# Altium footprint library CONN_B2B.PcbLib: 23 footprints (part 1 of 2)
Each footprint in its own frame and in the unit in brackets; x right, y up, seen from the top. Pads: shape width x height; smd on the part's side, far side on the other; paste and mask are expansions set on the pad; w line width, h text height; cw(c..) or ccw(c..) is an arc to the next point about the centre after c.
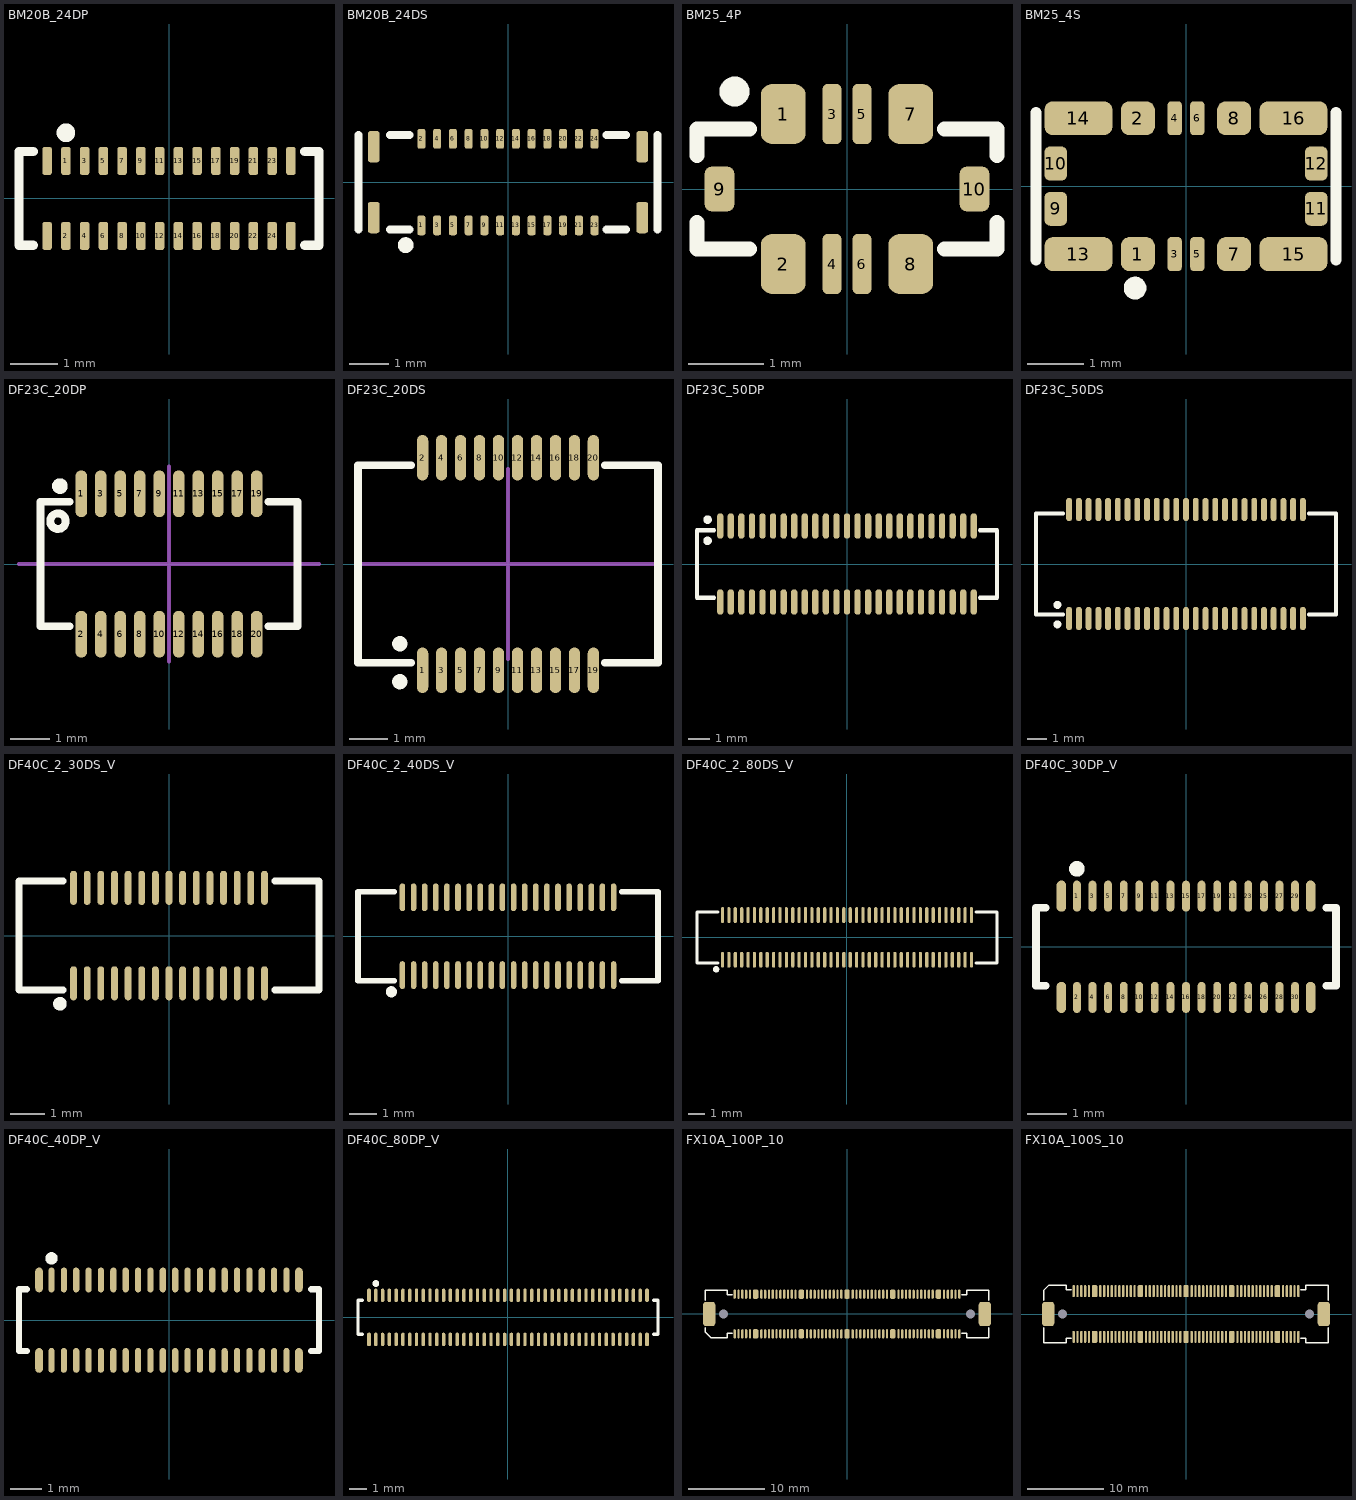
[diagram p0: the footprints below, top view; thin cyan lines are the x and y axes]

## BM20B_24DP [mm] "Hirose Connector BM20B(0.8)-24DP-0.4V(51) 24WAY pitch:0.4mm"
height 0.8
pads (28):
  rrect50% 0.2x0.6 smd mask+0.05: 1(-2.2,0.8) 2(-2.2,-0.8) 3(-1.8,0.8) 4(-1.8,-0.8) 5(-1.4,0.8) 6(-1.4,-0.8) 7(-1,0.8) 8(-1,-0.8) 9(-0.6,0.8) 10(-0.6,-0.8) 11(-0.2,0.8) 12(-0.2,-0.8) 13(0.2,0.8) 14(0.2,-0.8) 15(0.6,0.8) 16(0.6,-0.8) 17(1,0.8) 18(1,-0.8) 19(1.4,0.8) 20(1.4,-0.8) 21(1.8,0.8) 22(1.8,-0.8) 23(2.2,0.8) 24(2.2,-0.8) ""(-2.6,-0.8) ""(-2.6,0.8) ""(2.6,-0.8) ""(2.6,0.8)
Top Overlay:
  circle w0.2: c-2.2,1.4 r0.1
  lines w0.2: -2.9,-1 -3.2,-1 -3.2,1 -2.9,1 ; 2.9,-1 3.2,-1 3.2,1 2.9,1
3D body "BM20B(0.8)-24DP-0.4V.stp": height 0.67, standoff 0.01, extent -3.1,-0.88 3.1,0.9

## BM20B_24DS [mm] "Hirose Connector BM20B(0.8)-24DS-0.4V(51) 24WAY pitch:0.4mm"
height 0.8
pads (28):
  rrect50% 0.2x0.5 smd mask+0.05: 1(-2.2,-1.1) 2(-2.2,1.1) 3(-1.8,-1.1) 4(-1.8,1.1) 5(-1.4,-1.1) 6(-1.4,1.1) 7(-1,-1.1) 8(-1,1.1) 9(-0.6,-1.1) 10(-0.6,1.1) 11(-0.2,-1.1) 12(-0.2,1.1) 13(0.2,-1.1) 14(0.2,1.1) 15(0.6,-1.1) 16(0.6,1.1) 17(1,-1.1) 18(1,1.1) 19(1.4,-1.1) 20(1.4,1.1) 21(1.8,-1.1) 22(1.8,1.1) 23(2.2,-1.1) 24(2.2,1.1)
  rrect50% 0.3x0.8 smd mask+0.05: ""(-3.41,-0.9) ""(-3.41,0.9) ""(3.41,-0.9) ""(3.41,0.9)
Top Overlay:
  circle w0.2: c-2.6,-1.6 r0.1
  lines w0.2: -3.8,-1.2 -3.8,1.2 ; -3,-1.2 -2.5,-1.2 ; -3,1.2 -2.5,1.2 ; 2.5,-1.2 3,-1.2 ; 2.5,1.2 3,1.2 ; 3.8,-1.2 3.8,1.2
3D body "BM20B(0.8)-24DS-0.4V.stp": height 0.79, standoff -0.01, extent -3.645,-1.15 3.635,1.15

## BM25_4P [mm] "Conn B2B, for battery, Hirose BM25-4P-2-V(51)"
pads (10):
  rrect50% 0.6x0.8 smd paste-0.1 mask+0.05: 1(-0.85,1) 2(-0.85,-1) 7(0.85,1) 8(0.85,-1)
  rrect50% 0.25x0.8 smd mask+0.05: 3(-0.2,1) 4(-0.2,-1) 5(0.2,1) 6(0.2,-1)
  rrect50% 0.4x0.6 smd: 9(-1.7,0) 10(1.7,0)
Top Overlay:
  circle w0.2: c-1.5,1.3 r0.1
  lines w0.2: -2,-0.45 -2,-0.8 -1.3,-0.8 ; -2,0.45 -2,0.8 -1.3,0.8 ; 1.3,-0.8 2,-0.8 2,-0.45 ; 1.3,0.8 2,0.8 2,0.45
3D body "BM25-4P.stp": height 0.6, standoff 0, extent -1.965,-1.3 1.965,1.3

## BM25_4S [mm] "Conn B2B, for battery, Hirose BM25-4S_2-V(53)"
pads (16):
  rrect50% 0.6x0.6 smd paste-0.1 mask+0.05: 1(-0.85,-1.2) 2(-0.85,1.2) 7(0.85,-1.2) 8(0.85,1.2)
  rrect50% 0.25x0.6 smd mask+0.05: 3(-0.2,-1.2) 4(-0.2,1.2) 5(0.2,-1.2) 6(0.2,1.2)
  rrect50% 0.4x0.6 smd mask+0.05: 9(-2.3,-0.4) 10(-2.3,0.4) 11(2.3,-0.4) 12(2.3,0.4)
  rrect50% 1.2x0.6 smd paste-0.1 mask+0.05: 13(-1.9,-1.2) 14(-1.9,1.2) 15(1.9,-1.2) 16(1.9,1.2)
Top Overlay:
  circle w0.2: c-0.9,-1.8 r0.1
  lines w0.2: -2.65,-1.3 -2.65,1.3 ; 2.65,-1.3 2.65,1.3
3D body "BM25-4S.stp": height 0.7, standoff 0, extent -2.5,-1.3 2.5,1.3

## DF23C_20DP [mm] "Hirose Connector DF23C-20DP-0.5V(92) 20WAY pitch:0.5mm"
height 1.5
pads (20):
  oval 0.3x1.2 smd mask+0.075: 1(-2.25,1.8) 2(-2.25,-1.8) 3(-1.75,1.8) 4(-1.75,-1.8) 5(-1.25,1.8) 6(-1.25,-1.8) 7(-0.75,1.8) 8(-0.75,-1.8) 9(-0.25,1.8) 10(-0.25,-1.8) 11(0.25,1.8) 12(0.25,-1.8) 13(0.75,1.8) 14(0.75,-1.8) 15(1.25,1.8) 16(1.25,-1.8) 17(1.75,1.8) 18(1.75,-1.8) 19(2.25,1.8) 20(2.25,-1.8)
Top Overlay:
  circle w0.2: c-2.8,2 r0.1
  circle w0.2: c-2.85,1.1 r0.2
  lines w0.2: -2.55,-1.6 -3.3,-1.6 -3.3,1.6 -2.55,1.6 ; 2.55,-1.6 3.3,-1.6 3.3,1.6 2.55,1.6
Mechanical 13:
  lines w0.1: -3.85,0 3.85,0 ; 0,-2.5 0,2.5
3D body "DF23C-20DP-0.5V.stp": height 1.2, standoff 0, extent -3.25,-2.15 3.25,2.15

## DF23C_20DS [mm] "Hirose Connector DF23C-20DS-0.5V(51) 20WAY pitch:0.5mm"
height 1.5
pads (20):
  oval 0.3x1.2 smd mask+0.075: 1(-2.25,-2.8) 2(-2.25,2.8) 3(-1.75,-2.8) 4(-1.75,2.8) 5(-1.25,-2.8) 6(-1.25,2.8) 7(-0.75,-2.8) 8(-0.75,2.8) 9(-0.25,-2.8) 10(-0.25,2.8) 11(0.25,-2.8) 12(0.25,2.8) 13(0.75,-2.8) 14(0.75,2.8) 15(1.25,-2.8) 16(1.25,2.8) 17(1.75,-2.8) 18(1.75,2.8) 19(2.25,-2.8) 20(2.25,2.8)
Top Overlay:
  circle w0.2: c-2.85,-3.1 r0.1
  circle w0.2: c-2.85,-2.1 r0.1
  lines w0.2: -2.55,-2.6 -3.95,-2.6 -3.95,2.6 -2.55,2.6 ; 2.55,-2.6 3.95,-2.6 3.95,2.6 2.55,2.6
Mechanical 13:
  lines w0.1: -3.85,0 3.85,0 ; 0,-2.5 0,2.5
3D body "DF23C-20DS-0.5V.stp": height 1.42, standoff -0.03, extent -3.8,-3 3.8,3

## DF23C_50DP [mm] "Hirose Connector DF23C-50DP-0.5V(92) 50WAY pitch:0.5mm"
height 1.5
pads (50):
  oval 0.3x1.2 smd mask+0.075: 1(-6,1.8) 2(-6,-1.8) 3(-5.5,1.8) 4(-5.5,-1.8) 5(-5,1.8) 6(-5,-1.8) 7(-4.5,1.8) 8(-4.5,-1.8) 9(-4,1.8) 10(-4,-1.8) 11(-3.5,1.8) 12(-3.5,-1.8) 13(-3,1.8) 14(-3,-1.8) 15(-2.5,1.8) 16(-2.5,-1.8) 17(-2,1.8) 18(-2,-1.8) 19(-1.5,1.8) 20(-1.5,-1.8) 21(-1,1.8) 22(-1,-1.8) 23(-0.5,1.8) 24(-0.5,-1.8) 25(0,1.8) 26(0,-1.8) 27(0.5,1.8) 28(0.5,-1.8) 29(1,1.8) 30(1,-1.8) 31(1.5,1.8) 32(1.5,-1.8) 33(2,1.8) 34(2,-1.8) 35(2.5,1.8) 36(2.5,-1.8) 37(3,1.8) 38(3,-1.8) 39(3.5,1.8) 40(3.5,-1.8) 41(4,1.8) 42(4,-1.8) 43(4.5,1.8) 44(4.5,-1.8) 45(5,1.8) 46(5,-1.8) 47(5.5,1.8) 48(5.5,-1.8) 49(6,1.8) 50(6,-1.8)
Top Overlay:
  circle w0.2: c-6.6,1.1 r0.1
  circle w0.2: c-6.6,2.1 r0.1
  lines w0.2: -6.3,-1.6 -7.1,-1.6 -7.1,1.6 -6.3,1.6 ; 6.3,-1.6 7.1,-1.6 7.1,1.6 6.3,1.6
3D body "DF23C-50DP-0.5V.stp": height 1.2, standoff 0, extent -7,-2.15 7,2.15

## DF23C_50DS [mm] "Hirose Connector DF23C-50DS-0.5V(51) 50WAY pitch:0.5mm"
height 1.5
pads (50):
  oval 0.3x1.2 smd mask+0.075: 1(-6,-2.8) 2(-6,2.8) 3(-5.5,-2.8) 4(-5.5,2.8) 5(-5,-2.8) 6(-5,2.8) 7(-4.5,-2.8) 8(-4.5,2.8) 9(-4,-2.8) 10(-4,2.8) 11(-3.5,-2.8) 12(-3.5,2.8) 13(-3,-2.8) 14(-3,2.8) 15(-2.5,-2.8) 16(-2.5,2.8) 17(-2,-2.8) 18(-2,2.8) 19(-1.5,-2.8) 20(-1.5,2.8) 21(-1,-2.8) 22(-1,2.8) 23(-0.5,-2.8) 24(-0.5,2.8) 25(0,-2.8) 26(0,2.8) 27(0.5,-2.8) 28(0.5,2.8) 29(1,-2.8) 30(1,2.8) 31(1.5,-2.8) 32(1.5,2.8) 33(2,-2.8) 34(2,2.8) 35(2.5,-2.8) 36(2.5,2.8) 37(3,-2.8) 38(3,2.8) 39(3.5,-2.8) 40(3.5,2.8) 41(4,-2.8) 42(4,2.8) 43(4.5,-2.8) 44(4.5,2.8) 45(5,-2.8) 46(5,2.8) 47(5.5,-2.8) 48(5.5,2.8) 49(6,-2.8) 50(6,2.8)
Top Overlay:
  circle w0.2: c-6.6,-3.1 r0.1
  circle w0.2: c-6.6,-2.1 r0.1
  lines w0.2: -6.3,-2.6 -7.7,-2.6 -7.7,2.6 -6.3,2.6 ; 6.3,-2.6 7.7,-2.6 7.7,2.6 6.3,2.6
3D body "DF23C-50DS-0.5V.stp": height 1.42, standoff -0.03, extent -7.55,-3 7.55,3

## DF40C_2_30DS_V [mm] "CONN_DF40C, DF40C(2.0)- 30DS-0.4V(51)"
pads (30):
  oval 0.2x1 smd mask+0.05: 1(-2.8,-1.4) 2(-2.8,1.4) 3(-2.4,-1.4) 4(-2.4,1.4) 5(-2,-1.4) 6(-2,1.4) 7(-1.6,-1.4) 8(-1.6,1.4) 9(-1.2,-1.4) 10(-1.2,1.4) 11(-0.8,-1.4) 12(-0.8,1.4) 13(-0.4,-1.4) 14(-0.4,1.4) 15(0,-1.4) 16(0,1.4) 17(0.4,-1.4) 18(0.4,1.4) 19(0.8,-1.4) 20(0.8,1.4) 21(1.2,-1.4) 22(1.2,1.4) 23(1.6,-1.4) 24(1.6,1.4) 25(2,-1.4) 26(2,1.4) 27(2.4,-1.4) 28(2.4,1.4) 29(2.8,-1.4) 30(2.8,1.4)
Top Overlay:
  circle w0.2: c-3.2,-2 r0.1
  lines w0.2: -3.1,-1.6 -4.4,-1.6 -4.4,1.6 -3.1,1.6 ; 3.1,-1.6 4.4,-1.6 4.4,1.6 3.1,1.6
3D body "DF40C(2.0)-30DS-0.4V.stp": height 1.95, standoff 0, extent -4.3,-1.68 4.3,1.7

## DF40C_2_40DS_V [mm] "CONN_DF40C, DF40C(2.0)- 40DS-0.4V(51)"
pads (40):
  oval 0.2x1 smd mask+0.05: 1(-3.8,-1.4) 2(-3.8,1.4) 3(-3.4,-1.4) 4(-3.4,1.4) 5(-3,-1.4) 6(-3,1.4) 7(-2.6,-1.4) 8(-2.6,1.4) 9(-2.2,-1.4) 10(-2.2,1.4) 11(-1.8,-1.4) 12(-1.8,1.4) 13(-1.4,-1.4) 14(-1.4,1.4) 15(-1,-1.4) 16(-1,1.4) 17(-0.6,-1.4) 18(-0.6,1.4) 19(-0.2,-1.4) 20(-0.2,1.4) 21(0.2,-1.4) 22(0.2,1.4) 23(0.6,-1.4) 24(0.6,1.4) 25(1,-1.4) 26(1,1.4) 27(1.4,-1.4) 28(1.4,1.4) 29(1.8,-1.4) 30(1.8,1.4) 31(2.2,-1.4) 32(2.2,1.4) 33(2.6,-1.4) 34(2.6,1.4) 35(3,-1.4) 36(3,1.4) 37(3.4,-1.4) 38(3.4,1.4) 39(3.8,-1.4) 40(3.8,1.4)
Top Overlay:
  circle w0.2: c-4.2,-2 r0.1
  lines w0.2: -4.1,-1.6 -5.4,-1.6 -5.4,1.6 -4.1,1.6 ; 4.1,-1.6 5.4,-1.6 5.4,1.6 4.1,1.6
3D body "DF40C(2.0)-40DS-0.4V.stp": height 1.95, standoff 0, extent -5.3,-1.7 5.3,1.68

## DF40C_2_80DS_V [mm] "CONN_DF40C, DF40C(2.0)- 80DS-0.4V(51)"
pads (80):
  oval 0.2x1 smd mask+0.05: 1(-7.8,-1.4) 2(-7.8,1.4) 3(-7.4,-1.4) 4(-7.4,1.4) 5(-7,-1.4) 6(-7,1.4) 7(-6.6,-1.4) 8(-6.6,1.4) 9(-6.2,-1.4) 10(-6.2,1.4) 11(-5.8,-1.4) 12(-5.8,1.4) 13(-5.4,-1.4) 14(-5.4,1.4) 15(-5,-1.4) 16(-5,1.4) 17(-4.6,-1.4) 18(-4.6,1.4) 19(-4.2,-1.4) 20(-4.2,1.4) 21(-3.8,-1.4) 22(-3.8,1.4) 23(-3.4,-1.4) 24(-3.4,1.4) 25(-3,-1.4) 26(-3,1.4) 27(-2.6,-1.4) 28(-2.6,1.4) 29(-2.2,-1.4) 30(-2.2,1.4) 31(-1.8,-1.4) 32(-1.8,1.4) 33(-1.4,-1.4) 34(-1.4,1.4) 35(-1,-1.4) 36(-1,1.4) 37(-0.6,-1.4) 38(-0.6,1.4) 39(-0.2,-1.4) 40(-0.2,1.4) 41(0.2,-1.4) 42(0.2,1.4) 43(0.6,-1.4) 44(0.6,1.4) 45(1,-1.4) 46(1,1.4) 47(1.4,-1.4) 48(1.4,1.4) 49(1.8,-1.4) 50(1.8,1.4) 51(2.2,-1.4) 52(2.2,1.4) 53(2.6,-1.4) 54(2.6,1.4) 55(3,-1.4) 56(3,1.4) 57(3.4,-1.4) 58(3.4,1.4) 59(3.8,-1.4) 60(3.8,1.4) 61(4.2,-1.4) 62(4.2,1.4) 63(4.6,-1.4) 64(4.6,1.4) 65(5,-1.4) 66(5,1.4) 67(5.4,-1.4) 68(5.4,1.4) 69(5.8,-1.4) 70(5.8,1.4) 71(6.2,-1.4) 72(6.2,1.4) 73(6.6,-1.4) 74(6.6,1.4) 75(7,-1.4) 76(7,1.4) 77(7.4,-1.4) 78(7.4,1.4) 79(7.8,-1.4) 80(7.8,1.4)
Top Overlay:
  circle w0.2: c-8.2,-2 r0.1
  lines w0.2: -8.1,-1.6 -9.4,-1.6 -9.4,1.6 -8.1,1.6 ; 8.1,-1.6 9.4,-1.6 9.4,1.6 8.1,1.6
3D body "DF40C(2.0)-80DS.stp": height 1.94, standoff 0, extent -9.305,-1.69 9.295,1.69

## DF40C_30DP_V [mm] "CONN_DF40C, DF40C- 30DP-0.4V(51)"
pads (34):
  oval 0.2x0.8 smd mask+0.05: 1(-2.8,1.3) 2(-2.8,-1.3) 3(-2.4,1.3) 4(-2.4,-1.3) 5(-2,1.3) 6(-2,-1.3) 7(-1.6,1.3) 8(-1.6,-1.3) 9(-1.2,1.3) 10(-1.2,-1.3) 11(-0.8,1.3) 12(-0.8,-1.3) 13(-0.4,1.3) 14(-0.4,-1.3) 15(0,1.3) 16(0,-1.3) 17(0.4,1.3) 18(0.4,-1.3) 19(0.8,1.3) 20(0.8,-1.3) 21(1.2,1.3) 22(1.2,-1.3) 23(1.6,1.3) 24(1.6,-1.3) 25(2,1.3) 26(2,-1.3) 27(2.4,1.3) 28(2.4,-1.3) 29(2.8,1.3) 30(2.8,-1.3)
  oval 0.25x0.8 smd mask+0.05: ""(-3.2,-1.3) ""(-3.2,1.3) ""(3.2,-1.3) ""(3.2,1.3)
Top Overlay:
  circle w0.2: c-2.8,2 r0.1
  lines w0.2: -3.6,-1 -3.85,-1 -3.85,1 -3.6,1 ; 3.6,-1 3.85,-1 3.85,1 3.6,1
3D body "DF40C-30DP.stp": height 1.14, standoff 0, extent -3.76,-1.497 3.76,1.473

## DF40C_40DP_V [mm] "CONN_DF40C, DF40C- 40DP-0.4V(51)"
pads (44):
  oval 0.2x0.8 smd mask+0.05: 1(-3.8,1.3) 2(-3.8,-1.3) 3(-3.4,1.3) 4(-3.4,-1.3) 5(-3,1.3) 6(-3,-1.3) 7(-2.6,1.3) 8(-2.6,-1.3) 9(-2.2,1.3) 10(-2.2,-1.3) 11(-1.8,1.3) 12(-1.8,-1.3) 13(-1.4,1.3) 14(-1.4,-1.3) 15(-1,1.3) 16(-1,-1.3) 17(-0.6,1.3) 18(-0.6,-1.3) 19(-0.2,1.3) 20(-0.2,-1.3) 21(0.2,1.3) 22(0.2,-1.3) 23(0.6,1.3) 24(0.6,-1.3) 25(1,1.3) 26(1,-1.3) 27(1.4,1.3) 28(1.4,-1.3) 29(1.8,1.3) 30(1.8,-1.3) 31(2.2,1.3) 32(2.2,-1.3) 33(2.6,1.3) 34(2.6,-1.3) 35(3,1.3) 36(3,-1.3) 37(3.4,1.3) 38(3.4,-1.3) 39(3.8,1.3) 40(3.8,-1.3)
  oval 0.25x0.8 smd mask+0.05: ""(-4.2,-1.3) ""(-4.2,1.3) ""(4.2,-1.3) ""(4.2,1.3)
Top Overlay:
  circle w0.2: c-3.8,2 r0.1
  lines w0.2: -4.6,-1 -4.85,-1 -4.85,1 -4.6,1 ; 4.6,-1 4.85,-1 4.85,1 4.6,1
3D body "DF40C-40DP.stp": height 1.14, standoff 0, extent -4.76,-1.495 4.76,1.475

## DF40C_80DP_V [mm] "CONN_DF40C, DF40C-80DP-0.4V(51)"
pads (84):
  oval 0.2x0.8 smd mask+0.05: 1(-7.8,1.3) 2(-7.8,-1.3) 3(-7.4,1.3) 4(-7.4,-1.3) 5(-7,1.3) 6(-7,-1.3) 7(-6.6,1.3) 8(-6.6,-1.3) 9(-6.2,1.3) 10(-6.2,-1.3) 11(-5.8,1.3) 12(-5.8,-1.3) 13(-5.4,1.3) 14(-5.4,-1.3) 15(-5,1.3) 16(-5,-1.3) 17(-4.6,1.3) 18(-4.6,-1.3) 19(-4.2,1.3) 20(-4.2,-1.3) 21(-3.8,1.3) 22(-3.8,-1.3) 23(-3.4,1.3) 24(-3.4,-1.3) 25(-3,1.3) 26(-3,-1.3) 27(-2.6,1.3) 28(-2.6,-1.3) 29(-2.2,1.3) 30(-2.2,-1.3) 31(-1.8,1.3) 32(-1.8,-1.3) 33(-1.4,1.3) 34(-1.4,-1.3) 35(-1,1.3) 36(-1,-1.3) 37(-0.6,1.3) 38(-0.6,-1.3) 39(-0.2,1.3) 40(-0.2,-1.3) 41(0.2,1.3) 42(0.2,-1.3) 43(0.6,1.3) 44(0.6,-1.3) 45(1,1.3) 46(1,-1.3) 47(1.4,1.3) 48(1.4,-1.3) 49(1.8,1.3) 50(1.8,-1.3) 51(2.2,1.3) 52(2.2,-1.3) 53(2.6,1.3) 54(2.6,-1.3) 55(3,1.3) 56(3,-1.3) 57(3.4,1.3) 58(3.4,-1.3) 59(3.8,1.3) 60(3.8,-1.3) 61(4.2,1.3) 62(4.2,-1.3) 63(4.6,1.3) 64(4.6,-1.3) 65(5,1.3) 66(5,-1.3) 67(5.4,1.3) 68(5.4,-1.3) 69(5.8,1.3) 70(5.8,-1.3) 71(6.2,1.3) 72(6.2,-1.3) 73(6.6,1.3) 74(6.6,-1.3) 75(7,1.3) 76(7,-1.3) 77(7.4,1.3) 78(7.4,-1.3) 79(7.8,1.3) 80(7.8,-1.3)
  oval 0.25x0.8 smd mask+0.05: ""(-8.2,-1.3) ""(-8.2,1.3) ""(8.2,-1.3) ""(8.2,1.3)
Top Overlay:
  circle w0.2: c-7.8,2 r0.1
  lines w0.2: -8.6,-1 -8.85,-1 -8.85,1 -8.6,1 ; 8.6,-1 8.85,-1 8.85,1 8.6,1
3D body "DF40C-80DP.stp": height 1.14, standoff 0, extent -8.76,-1.5 8.76,1.47

## FX10A_100P_10 [mm] "FX10A-100P/10-SV(71)"
pads (114):
  oval 0.3x1.2 smd mask+0.05: 1(-14.75,-2.6) 2(-14.75,2.6) 3(-14.25,-2.6) 4(-14.25,2.6) 5(-13.75,-2.6) 6(-13.75,2.6) 7(-13.25,-2.6) 8(-13.25,2.6) 9(-12.75,-2.6) 10(-12.75,2.6) 11(-11.25,-2.6) 12(-11.25,2.6) 13(-10.75,-2.6) 14(-10.75,2.6) 15(-10.25,-2.6) 16(-10.25,2.6) 17(-9.75,-2.6) 18(-9.75,2.6) 19(-9.25,-2.6) 20(-9.25,2.6) 21(-8.75,-2.6) 22(-8.75,2.6) 23(-8.25,-2.6) 24(-8.25,2.6) 25(-7.75,-2.6) 26(-7.75,2.6) 27(-7.25,-2.6) 28(-7.25,2.6) 29(-6.75,-2.6) 30(-6.75,2.6) 31(-5.25,-2.6) 32(-5.25,2.6) 33(-4.75,-2.6) 34(-4.75,2.6) 35(-4.25,-2.6) 36(-4.25,2.6) 37(-3.75,-2.6) 38(-3.75,2.6) 39(-3.25,-2.6) 40(-3.25,2.6) 41(-2.75,-2.6) 42(-2.75,2.6) 43(-2.25,-2.6) 44(-2.25,2.6) 45(-1.75,-2.6) 46(-1.75,2.6) 47(-1.25,-2.6) 48(-1.25,2.6) 49(-0.75,-2.6) 50(-0.75,2.6) 51(0.75,-2.6) 52(0.75,2.6) 53(1.25,-2.6) 54(1.25,2.6) 55(1.75,-2.6) 56(1.75,2.6) 57(2.25,-2.6) 58(2.25,2.6) 59(2.75,-2.6) 60(2.75,2.6) 61(3.25,-2.6) 62(3.25,2.6) 63(3.75,-2.6) 64(3.75,2.6) 65(4.25,-2.6) 66(4.25,2.6) 67(4.75,-2.6) 68(4.75,2.6) 69(5.25,-2.6) 70(5.25,2.6) 71(6.75,-2.6) 72(6.75,2.6) 73(7.25,-2.6) 74(7.25,2.6) 75(7.75,-2.6) 76(7.75,2.6) 77(8.25,-2.6) 78(8.25,2.6) 79(8.75,-2.6) 80(8.75,2.6) 81(9.25,-2.6) 82(9.25,2.6) 83(9.75,-2.6) 84(9.75,2.6) 85(10.25,-2.6) 86(10.25,2.6) 87(10.75,-2.6) 88(10.75,2.6) 89(11.25,-2.6) 90(11.25,2.6) 91(12.75,-2.6) 92(12.75,2.6) 93(13.25,-2.6) 94(13.25,2.6) 95(13.75,-2.6) 96(13.75,2.6) 97(14.25,-2.6) 98(14.25,2.6) 99(14.75,-2.6) 100(14.75,2.6)
  rrect50% 0.7x1.2 smd: G0(-12,-2.6) G1(-12,2.6) G2(-6,-2.6) G3(-6,2.6) G4(0,-2.6) G5(0,2.6) G6(6,-2.6) G7(6,2.6) G8(12,-2.6) G9(12,2.6)
  rrect50% 1.6x3.2 smd mask+0.075: ""(-18.1,0) ""(18.1,0)
  round 0.5 hole 1.2 unplated: ""(-16.2,0) ""(16.2,0)
Top Overlay:
  lines w0.2: -18.6,-1.8 -18.6,-2.4 -17.9,-3.1 -15.7,-3.1 -15.7,-2.5 -15.1,-2.5 ; -18.6,1.8 -18.6,3.1 -15.7,3.1 -15.7,2.5 -15.1,2.5 ; 15.1,-2.5 15.7,-2.5 15.7,-3.1 18.6,-3.1 18.6,-1.8 ; 15.1,2.5 15.7,2.5 15.7,3.1 18.6,3.1 18.6,1.8
3D body "FX10A-100P10-SV.stp": height 3.51, standoff -0.59, extent -18.5,-2.95 18.6,2.95

## FX10A_100S_10 [mm] "FX10A-100S/10-SV(71)"
pads (114):
  oval 0.3x1.6 smd mask+0.05: 1(-14.75,3) 2(-14.75,-3) 3(-14.25,3) 4(-14.25,-3) 5(-13.75,3) 6(-13.75,-3) 7(-13.25,3) 8(-13.25,-3) 9(-12.75,3) 10(-12.75,-3) 11(-11.25,3) 12(-11.25,-3) 13(-10.75,3) 14(-10.75,-3) 15(-10.25,3) 16(-10.25,-3) 17(-9.75,3) 18(-9.75,-3) 19(-9.25,3) 20(-9.25,-3) 21(-8.75,3) 22(-8.75,-3) 23(-8.25,3) 24(-8.25,-3) 25(-7.75,3) 26(-7.75,-3) 27(-7.25,3) 28(-7.25,-3) 29(-6.75,3) 30(-6.75,-3) 31(-5.25,3) 32(-5.25,-3) 33(-4.75,3) 34(-4.75,-3) 35(-4.25,3) 36(-4.25,-3) 37(-3.75,3) 38(-3.75,-3) 39(-3.25,3) 40(-3.25,-3) 41(-2.75,3) 42(-2.75,-3) 43(-2.25,3) 44(-2.25,-3) 45(-1.75,3) 46(-1.75,-3) 47(-1.25,3) 48(-1.25,-3) 49(-0.75,3) 50(-0.75,-3) 51(0.75,3) 52(0.75,-3) 53(1.25,3) 54(1.25,-3) 55(1.75,3) 56(1.75,-3) 57(2.25,3) 58(2.25,-3) 59(2.75,3) 60(2.75,-3) 61(3.25,3) 62(3.25,-3) 63(3.75,3) 64(3.75,-3) 65(4.25,3) 66(4.25,-3) 67(4.75,3) 68(4.75,-3) 69(5.25,3) 70(5.25,-3) 71(6.75,3) 72(6.75,-3) 73(7.25,3) 74(7.25,-3) 75(7.75,3) 76(7.75,-3) 77(8.25,3) 78(8.25,-3) 79(8.75,3) 80(8.75,-3) 81(9.25,3) 82(9.25,-3) 83(9.75,3) 84(9.75,-3) 85(10.25,3) 86(10.25,-3) 87(10.75,3) 88(10.75,-3) 89(11.25,3) 90(11.25,-3) 91(12.75,3) 92(12.75,-3) 93(13.25,3) 94(13.25,-3) 95(13.75,3) 96(13.75,-3) 97(14.25,3) 98(14.25,-3) 99(14.75,3) 100(14.75,-3)
  rrect50% 0.7x1.6 smd: G0(-12,3) G1(-12,-3) G2(-6,3) G3(-6,-3) G4(0,3) G5(0,-3) G6(6,3) G7(6,-3) G8(12,3) G9(12,-3)
  rrect50% 1.6x3.2 smd mask+0.075: ""(-18.1,0) ""(18.1,0)
  round 0.5 hole 1.2 unplated: ""(-16.2,0) ""(16.2,0)
Top Overlay:
  lines w0.2: -18.7,-1.8 -18.7,-3.8 -15.7,-3.8 -15.7,-3.2 -15.1,-3.2 ; -18.7,1.8 -18.7,3.1 -18,3.8 -15.7,3.8 -15.7,3.2 -15.1,3.2 ; 15.1,-3.2 15.7,-3.2 15.7,-3.8 18.7,-3.8 18.7,-1.8 ; 15.1,3.2 15.7,3.2 15.7,3.8 18.7,3.8 18.7,1.8
3D body "FX10A-100S10-SV.stp": height 3.22, standoff -0.58, extent -18.6,-3.65 18.5,3.65